# Altium integrated library Weidmueller_OMNIMATE_Signal.IntLib: 2550 symbols (part 8 of 45)
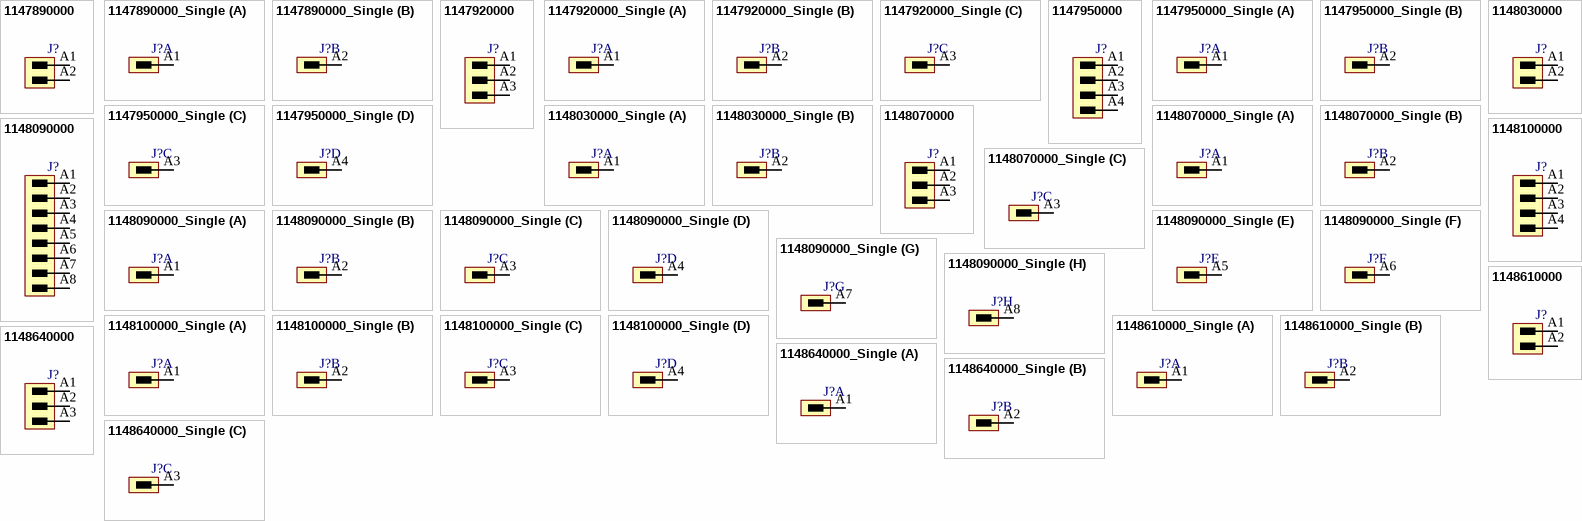
[diagram p218: symbols 1147890000 to 1148640000_Single]

## 1148100000_Single
designator J?
OMNIMATE Signal - series BL/SL 5.08; PartNumber: 1148100000; Manufacturer: Weidmueller; Short_text_for_material: SL 5.08HC/04/90B 3.2SN OR BX; Side_termination_characteristic: Dovetails for fixing blocks; Mounting_onto_the_PCB: Solder connection; Pitch_mm: 5.08 mm; Pitch_inch: 0.2 inch; No_of_poles: 4; Outgoing_elbow: 90°; Solder_pin_length_mm: 3.2 mm; Contact_material: Cu-Leg; Contact_surface: tinned; Insulating_material: PA GF; UL_94_flammability_rating: V-0; Rated_voltage_for_surge_voltage_class_pollution_degree_II_2: 400 V; Rated_voltage_use_group_B_UL_1059: 300 V; Rated_current_use_group_B_UL_1059: 15 A; PackageReference: SL_5_08HC_90B_04; Colour: Orange; Packaging: Box; Qty: 100 PCS; Revision: V1; ComponentLink1Description: Manufacturer URL; ComponentLink1URL: http://www.weidmueller.com/; ComponentLink2Description: URL Link1; ComponentLink2URL: http://catalog.weidmueller.com/catalog/Start.do?localeId=en&ObjectID=1148100000
footprint SL_5_08HC_90B_04 (OMNIMATE Signal - Serie BL/SL 5.08  SL 5.08HC/04/90B 3.2)
part A pins: A1
part B pins: A2
part C pins: A3
part D pins: A4

## 1148610000
designator J?
OMNIMATE Signal - series BL/SL 5.08; PartNumber: 1148610000; Manufacturer: Weidmueller; Short_text_for_material: SL 5.08HC/02/90F 3.2SN OR BX; Side_termination_characteristic: Flange; Mounting_onto_the_PCB: Solder connection; Pitch_mm: 5.08 mm; Pitch_inch: 0.2 inch; No_of_poles: 2; Outgoing_elbow: 90°; Solder_pin_length_mm: 3.2 mm; Contact_material: Cu-Leg; Contact_surface: tinned; Insulating_material: PA GF; UL_94_flammability_rating: V-0; Rated_voltage_for_surge_voltage_class_pollution_degree_II_2: 400 V; Rated_voltage_use_group_B_UL_1059: 300 V; Rated_current_use_group_B_UL_1059: 15 A; PackageReference: SL_5_08HC_90F_02; Colour: Orange; Packaging: Box; Qty: 100 PCS; Revision: V1; ComponentLink1Description: Manufacturer URL; ComponentLink1URL: http://www.weidmueller.com/; ComponentLink2Description: URL Link1; ComponentLink2URL: http://catalog.weidmueller.com/catalog/Start.do?localeId=en&ObjectID=1148610000
footprint SL_5_08HC_90F_02 (OMNIMATE Signal - Serie BL/SL 5.08  SL 5.08HC/02/90F 3.2)
pins: A1, A2

## 1148610000_Single
designator J?
OMNIMATE Signal - series BL/SL 5.08; PartNumber: 1148610000; Manufacturer: Weidmueller; Short_text_for_material: SL 5.08HC/02/90F 3.2SN OR BX; Side_termination_characteristic: Flange; Mounting_onto_the_PCB: Solder connection; Pitch_mm: 5.08 mm; Pitch_inch: 0.2 inch; No_of_poles: 2; Outgoing_elbow: 90°; Solder_pin_length_mm: 3.2 mm; Contact_material: Cu-Leg; Contact_surface: tinned; Insulating_material: PA GF; UL_94_flammability_rating: V-0; Rated_voltage_for_surge_voltage_class_pollution_degree_II_2: 400 V; Rated_voltage_use_group_B_UL_1059: 300 V; Rated_current_use_group_B_UL_1059: 15 A; PackageReference: SL_5_08HC_90F_02; Colour: Orange; Packaging: Box; Qty: 100 PCS; Revision: V1; ComponentLink1Description: Manufacturer URL; ComponentLink1URL: http://www.weidmueller.com/; ComponentLink2Description: URL Link1; ComponentLink2URL: http://catalog.weidmueller.com/catalog/Start.do?localeId=en&ObjectID=1148610000
footprint SL_5_08HC_90F_02 (OMNIMATE Signal - Serie BL/SL 5.08  SL 5.08HC/02/90F 3.2)
part A pins: A1
part B pins: A2

## 1148640000
designator J?
OMNIMATE Signal - series BL/SL 5.08; PartNumber: 1148640000; Manufacturer: Weidmueller; Short_text_for_material: SL 5.08HC/03/90F 3.2SN OR BX; Side_termination_characteristic: Flange; Mounting_onto_the_PCB: Solder connection; Pitch_mm: 5.08 mm; Pitch_inch: 0.2 inch; No_of_poles: 3; Outgoing_elbow: 90°; Solder_pin_length_mm: 3.2 mm; Contact_material: Cu-Leg; Contact_surface: tinned; Insulating_material: PA GF; UL_94_flammability_rating: V-0; Rated_voltage_for_surge_voltage_class_pollution_degree_II_2: 400 V; Rated_voltage_use_group_B_UL_1059: 300 V; Rated_current_use_group_B_UL_1059: 15 A; PackageReference: SL_5_08HC_90F_03; Colour: Orange; Packaging: Box; Qty: 100 PCS; Revision: V1; ComponentLink1Description: Manufacturer URL; ComponentLink1URL: http://www.weidmueller.com/; ComponentLink2Description: URL Link1; ComponentLink2URL: http://catalog.weidmueller.com/catalog/Start.do?localeId=en&ObjectID=1148640000
footprint SL_5_08HC_90F_03 (OMNIMATE Signal - Serie BL/SL 5.08  SL 5.08HC/03/90F 3.2)
pins: A1, A2, A3

## 1148640000_Single
designator J?
OMNIMATE Signal - series BL/SL 5.08; PartNumber: 1148640000; Manufacturer: Weidmueller; Short_text_for_material: SL 5.08HC/03/90F 3.2SN OR BX; Side_termination_characteristic: Flange; Mounting_onto_the_PCB: Solder connection; Pitch_mm: 5.08 mm; Pitch_inch: 0.2 inch; No_of_poles: 3; Outgoing_elbow: 90°; Solder_pin_length_mm: 3.2 mm; Contact_material: Cu-Leg; Contact_surface: tinned; Insulating_material: PA GF; UL_94_flammability_rating: V-0; Rated_voltage_for_surge_voltage_class_pollution_degree_II_2: 400 V; Rated_voltage_use_group_B_UL_1059: 300 V; Rated_current_use_group_B_UL_1059: 15 A; PackageReference: SL_5_08HC_90F_03; Colour: Orange; Packaging: Box; Qty: 100 PCS; Revision: V1; ComponentLink1Description: Manufacturer URL; ComponentLink1URL: http://www.weidmueller.com/; ComponentLink2Description: URL Link1; ComponentLink2URL: http://catalog.weidmueller.com/catalog/Start.do?localeId=en&ObjectID=1148640000
footprint SL_5_08HC_90F_03 (OMNIMATE Signal - Serie BL/SL 5.08  SL 5.08HC/03/90F 3.2)
part A pins: A1
part B pins: A2
part C pins: A3

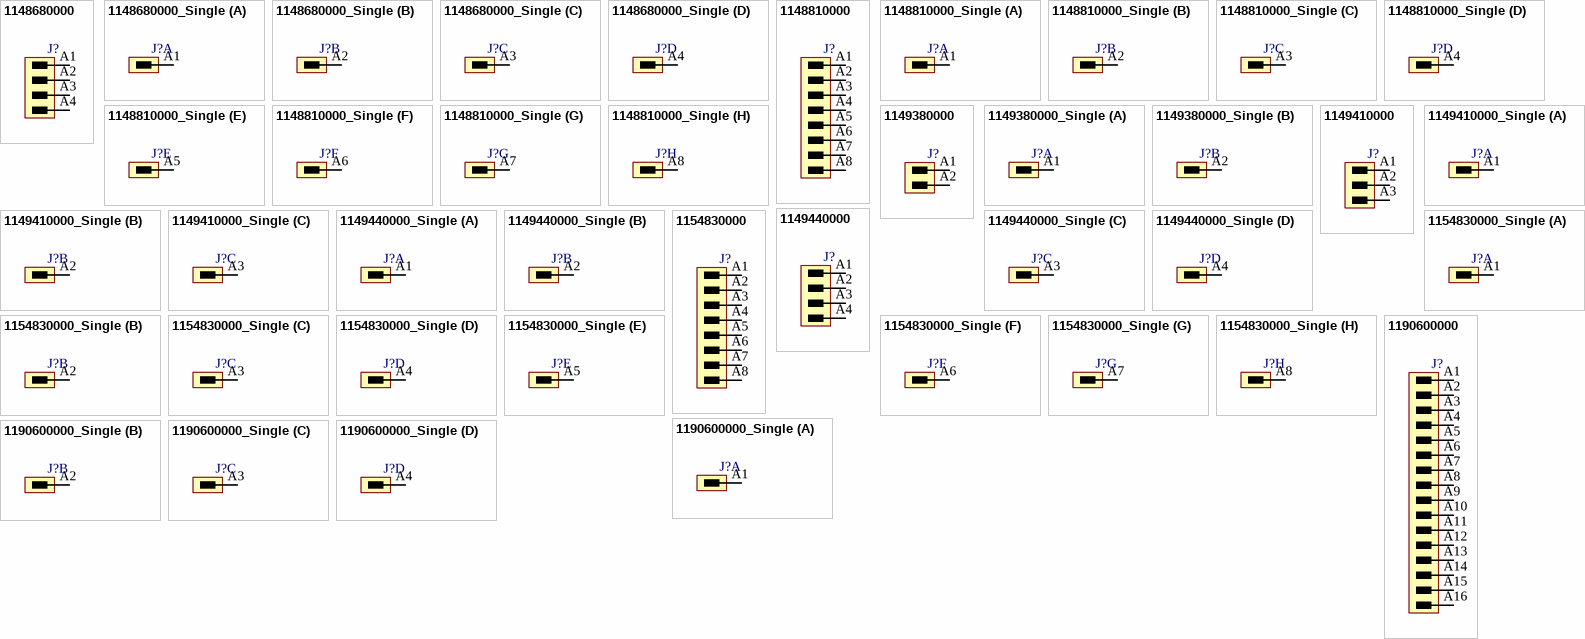
[diagram p44: symbols 1148680000 to 1190600000_Single]

## 1148680000
designator J?
OMNIMATE Signal - series BL/SL 5.08; PartNumber: 1148680000; Manufacturer: Weidmueller; Short_text_for_material: SL 5.08HC/04/90F 3.2SN OR BX; Side_termination_characteristic: Flange; Mounting_onto_the_PCB: Solder connection; Pitch_mm: 5.08 mm; Pitch_inch: 0.2 inch; No_of_poles: 4; Outgoing_elbow: 90°; Solder_pin_length_mm: 3.2 mm; Contact_material: Cu-Leg; Contact_surface: tinned; Insulating_material: PA GF; UL_94_flammability_rating: V-0; Rated_voltage_for_surge_voltage_class_pollution_degree_II_2: 400 V; Rated_voltage_use_group_B_UL_1059: 300 V; Rated_current_use_group_B_UL_1059: 15 A; PackageReference: SL_5_08HC_90F_04; Colour: Orange; Packaging: Box; Qty: 100 PCS; Revision: V1; ComponentLink1Description: Manufacturer URL; ComponentLink1URL: http://www.weidmueller.com/; ComponentLink2Description: URL Link1; ComponentLink2URL: http://catalog.weidmueller.com/catalog/Start.do?localeId=en&ObjectID=1148680000
footprint SL_5_08HC_90F_04 (OMNIMATE Signal - Serie BL/SL 5.08  SL 5.08HC/04/90F 3.2)
pins: A1, A2, A3, A4

## 1148680000_Single
designator J?
OMNIMATE Signal - series BL/SL 5.08; PartNumber: 1148680000; Manufacturer: Weidmueller; Short_text_for_material: SL 5.08HC/04/90F 3.2SN OR BX; Side_termination_characteristic: Flange; Mounting_onto_the_PCB: Solder connection; Pitch_mm: 5.08 mm; Pitch_inch: 0.2 inch; No_of_poles: 4; Outgoing_elbow: 90°; Solder_pin_length_mm: 3.2 mm; Contact_material: Cu-Leg; Contact_surface: tinned; Insulating_material: PA GF; UL_94_flammability_rating: V-0; Rated_voltage_for_surge_voltage_class_pollution_degree_II_2: 400 V; Rated_voltage_use_group_B_UL_1059: 300 V; Rated_current_use_group_B_UL_1059: 15 A; PackageReference: SL_5_08HC_90F_04; Colour: Orange; Packaging: Box; Qty: 100 PCS; Revision: V1; ComponentLink1Description: Manufacturer URL; ComponentLink1URL: http://www.weidmueller.com/; ComponentLink2Description: URL Link1; ComponentLink2URL: http://catalog.weidmueller.com/catalog/Start.do?localeId=en&ObjectID=1148680000
footprint SL_5_08HC_90F_04 (OMNIMATE Signal - Serie BL/SL 5.08  SL 5.08HC/04/90F 3.2)
part A pins: A1
part B pins: A2
part C pins: A3
part D pins: A4

## 1148810000
designator J?
OMNIMATE Signal - series BL/SL 5.08; PartNumber: 1148810000; Manufacturer: Weidmueller; Short_text_for_material: SL 5.08HC/08/90F 3.2SN OR BX; Side_termination_characteristic: Flange; Mounting_onto_the_PCB: Solder connection; Pitch_mm: 5.08 mm; Pitch_inch: 0.2 inch; No_of_poles: 8; Outgoing_elbow: 90°; Solder_pin_length_mm: 3.2 mm; Contact_material: Cu-Leg; Contact_surface: tinned; Insulating_material: PA GF; UL_94_flammability_rating: V-0; Rated_voltage_for_surge_voltage_class_pollution_degree_II_2: 400 V; Rated_voltage_use_group_B_UL_1059: 300 V; Rated_current_use_group_B_UL_1059: 15 A; PackageReference: SL_5_08HC_90F_08; Colour: Orange; Packaging: Box; Qty: 50 PCS; Revision: V1; ComponentLink1Description: Manufacturer URL; ComponentLink1URL: http://www.weidmueller.com/; ComponentLink2Description: URL Link1; ComponentLink2URL: http://catalog.weidmueller.com/catalog/Start.do?localeId=en&ObjectID=1148810000
footprint SL_5_08HC_90F_08 (OMNIMATE Signal - Serie BL/SL 5.08  SL 5.08HC/08/90F 3.2)
pins: A1, A2, A3, A4, A5, A6, A7, A8

## 1148810000_Single
designator J?
OMNIMATE Signal - series BL/SL 5.08; PartNumber: 1148810000; Manufacturer: Weidmueller; Short_text_for_material: SL 5.08HC/08/90F 3.2SN OR BX; Side_termination_characteristic: Flange; Mounting_onto_the_PCB: Solder connection; Pitch_mm: 5.08 mm; Pitch_inch: 0.2 inch; No_of_poles: 8; Outgoing_elbow: 90°; Solder_pin_length_mm: 3.2 mm; Contact_material: Cu-Leg; Contact_surface: tinned; Insulating_material: PA GF; UL_94_flammability_rating: V-0; Rated_voltage_for_surge_voltage_class_pollution_degree_II_2: 400 V; Rated_voltage_use_group_B_UL_1059: 300 V; Rated_current_use_group_B_UL_1059: 15 A; PackageReference: SL_5_08HC_90F_08; Colour: Orange; Packaging: Box; Qty: 50 PCS; Revision: V1; ComponentLink1Description: Manufacturer URL; ComponentLink1URL: http://www.weidmueller.com/; ComponentLink2Description: URL Link1; ComponentLink2URL: http://catalog.weidmueller.com/catalog/Start.do?localeId=en&ObjectID=1148810000
footprint SL_5_08HC_90F_08 (OMNIMATE Signal - Serie BL/SL 5.08  SL 5.08HC/08/90F 3.2)
part A pins: A1
part B pins: A2
part C pins: A3
part D pins: A4
part E pins: A5
part F pins: A6
part G pins: A7
part H pins: A8

## 1149380000
designator J?
OMNIMATE Signal - series BL/SL 5.08; PartNumber: 1149380000; Manufacturer: Weidmueller; Short_text_for_material: SL 5.08HC/02/90LF 3.2SN OR BX; Side_termination_characteristic: Solder flange; Mounting_onto_the_PCB: Solder connection; Pitch_mm: 5.08 mm; Pitch_inch: 0.2 inch; No_of_poles: 2; Outgoing_elbow: 90°; Solder_pin_length_mm: 3.2 mm; Contact_material: Cu-Leg; Contact_surface: tinned; Insulating_material: PA GF; UL_94_flammability_rating: V-0; Rated_voltage_for_surge_voltage_class_pollution_degree_II_2: 400 V; Rated_voltage_use_group_B_UL_1059: 300 V; Rated_current_use_group_B_UL_1059: 15 A; PackageReference: SL_5_08HC_90LF_02; Colour: Orange; Packaging: Box; Qty: 100 PCS; Revision: V1; ComponentLink1Description: Manufacturer URL; ComponentLink1URL: http://www.weidmueller.com/; ComponentLink2Description: URL Link1; ComponentLink2URL: http://catalog.weidmueller.com/catalog/Start.do?localeId=en&ObjectID=1149380000
footprint SL_5_08HC_90LF_02 (OMNIMATE Signal - Serie BL/SL 5.08  SL 5.08HC/02/90LF 3.2)
pins: A1, A2

## 1149380000_Single
designator J?
OMNIMATE Signal - series BL/SL 5.08; PartNumber: 1149380000; Manufacturer: Weidmueller; Short_text_for_material: SL 5.08HC/02/90LF 3.2SN OR BX; Side_termination_characteristic: Solder flange; Mounting_onto_the_PCB: Solder connection; Pitch_mm: 5.08 mm; Pitch_inch: 0.2 inch; No_of_poles: 2; Outgoing_elbow: 90°; Solder_pin_length_mm: 3.2 mm; Contact_material: Cu-Leg; Contact_surface: tinned; Insulating_material: PA GF; UL_94_flammability_rating: V-0; Rated_voltage_for_surge_voltage_class_pollution_degree_II_2: 400 V; Rated_voltage_use_group_B_UL_1059: 300 V; Rated_current_use_group_B_UL_1059: 15 A; PackageReference: SL_5_08HC_90LF_02; Colour: Orange; Packaging: Box; Qty: 100 PCS; Revision: V1; ComponentLink1Description: Manufacturer URL; ComponentLink1URL: http://www.weidmueller.com/; ComponentLink2Description: URL Link1; ComponentLink2URL: http://catalog.weidmueller.com/catalog/Start.do?localeId=en&ObjectID=1149380000
footprint SL_5_08HC_90LF_02 (OMNIMATE Signal - Serie BL/SL 5.08  SL 5.08HC/02/90LF 3.2)
part A pins: A1
part B pins: A2

## 1149410000
designator J?
OMNIMATE Signal - series BL/SL 5.08; PartNumber: 1149410000; Manufacturer: Weidmueller; Short_text_for_material: SL 5.08HC/03/90LF 3.2SN OR BX; Side_termination_characteristic: Solder flange; Mounting_onto_the_PCB: Solder connection; Pitch_mm: 5.08 mm; Pitch_inch: 0.2 inch; No_of_poles: 3; Outgoing_elbow: 90°; Solder_pin_length_mm: 3.2 mm; Contact_material: Cu-Leg; Contact_surface: tinned; Insulating_material: PA GF; UL_94_flammability_rating: V-0; Rated_voltage_for_surge_voltage_class_pollution_degree_II_2: 400 V; Rated_voltage_use_group_B_UL_1059: 300 V; Rated_current_use_group_B_UL_1059: 15 A; PackageReference: SL_5_08HC_90LF_03; Colour: Orange; Packaging: Box; Qty: 100 PCS; Revision: V1; ComponentLink1Description: Manufacturer URL; ComponentLink1URL: http://www.weidmueller.com/; ComponentLink2Description: URL Link1; ComponentLink2URL: http://catalog.weidmueller.com/catalog/Start.do?localeId=en&ObjectID=1149410000
footprint SL_5_08HC_90LF_03 (OMNIMATE Signal - Serie BL/SL 5.08  SL 5.08HC/03/90LF 3.2)
pins: A1, A2, A3

## 1149410000_Single
designator J?
OMNIMATE Signal - series BL/SL 5.08; PartNumber: 1149410000; Manufacturer: Weidmueller; Short_text_for_material: SL 5.08HC/03/90LF 3.2SN OR BX; Side_termination_characteristic: Solder flange; Mounting_onto_the_PCB: Solder connection; Pitch_mm: 5.08 mm; Pitch_inch: 0.2 inch; No_of_poles: 3; Outgoing_elbow: 90°; Solder_pin_length_mm: 3.2 mm; Contact_material: Cu-Leg; Contact_surface: tinned; Insulating_material: PA GF; UL_94_flammability_rating: V-0; Rated_voltage_for_surge_voltage_class_pollution_degree_II_2: 400 V; Rated_voltage_use_group_B_UL_1059: 300 V; Rated_current_use_group_B_UL_1059: 15 A; PackageReference: SL_5_08HC_90LF_03; Colour: Orange; Packaging: Box; Qty: 100 PCS; Revision: V1; ComponentLink1Description: Manufacturer URL; ComponentLink1URL: http://www.weidmueller.com/; ComponentLink2Description: URL Link1; ComponentLink2URL: http://catalog.weidmueller.com/catalog/Start.do?localeId=en&ObjectID=1149410000
footprint SL_5_08HC_90LF_03 (OMNIMATE Signal - Serie BL/SL 5.08  SL 5.08HC/03/90LF 3.2)
part A pins: A1
part B pins: A2
part C pins: A3

## 1149440000
designator J?
OMNIMATE Signal - series BL/SL 5.08; PartNumber: 1149440000; Manufacturer: Weidmueller; Short_text_for_material: SL 5.08HC/04/90LF 3.2SN OR BX; Side_termination_characteristic: Solder flange; Mounting_onto_the_PCB: Solder connection; Pitch_mm: 5.08 mm; Pitch_inch: 0.2 inch; No_of_poles: 4; Outgoing_elbow: 90°; Solder_pin_length_mm: 3.2 mm; Contact_material: Cu-Leg; Contact_surface: tinned; Insulating_material: PA GF; UL_94_flammability_rating: V-0; Rated_voltage_for_surge_voltage_class_pollution_degree_II_2: 400 V; Rated_voltage_use_group_B_UL_1059: 300 V; Rated_current_use_group_B_UL_1059: 15 A; PackageReference: SL_5_08HC_90LF_04; Colour: Orange; Packaging: Box; Qty: 100 PCS; Revision: V1; ComponentLink1Description: Manufacturer URL; ComponentLink1URL: http://www.weidmueller.com/; ComponentLink2Description: URL Link1; ComponentLink2URL: http://catalog.weidmueller.com/catalog/Start.do?localeId=en&ObjectID=1149440000
footprint SL_5_08HC_90LF_04 (OMNIMATE Signal - Serie BL/SL 5.08  SL 5.08HC/04/90LF 3.2)
pins: A1, A2, A3, A4

## 1149440000_Single
designator J?
OMNIMATE Signal - series BL/SL 5.08; PartNumber: 1149440000; Manufacturer: Weidmueller; Short_text_for_material: SL 5.08HC/04/90LF 3.2SN OR BX; Side_termination_characteristic: Solder flange; Mounting_onto_the_PCB: Solder connection; Pitch_mm: 5.08 mm; Pitch_inch: 0.2 inch; No_of_poles: 4; Outgoing_elbow: 90°; Solder_pin_length_mm: 3.2 mm; Contact_material: Cu-Leg; Contact_surface: tinned; Insulating_material: PA GF; UL_94_flammability_rating: V-0; Rated_voltage_for_surge_voltage_class_pollution_degree_II_2: 400 V; Rated_voltage_use_group_B_UL_1059: 300 V; Rated_current_use_group_B_UL_1059: 15 A; PackageReference: SL_5_08HC_90LF_04; Colour: Orange; Packaging: Box; Qty: 100 PCS; Revision: V1; ComponentLink1Description: Manufacturer URL; ComponentLink1URL: http://www.weidmueller.com/; ComponentLink2Description: URL Link1; ComponentLink2URL: http://catalog.weidmueller.com/catalog/Start.do?localeId=en&ObjectID=1149440000
footprint SL_5_08HC_90LF_04 (OMNIMATE Signal - Serie BL/SL 5.08  SL 5.08HC/04/90LF 3.2)
part A pins: A1
part B pins: A2
part C pins: A3
part D pins: A4

## 1154830000
designator J?
OMNIMATE Signal - series BL/SL 5.08; PartNumber: 1154830000; Manufacturer: Weidmueller; Short_text_for_material: SL 5.08HC/08/90B 3.2SN OR BX; Side_termination_characteristic: Dovetails for fixing blocks; Mounting_onto_the_PCB: Solder connection; Pitch_mm: 5.08 mm; Pitch_inch: 0.2 inch; No_of_poles: 8; Outgoing_elbow: 90°; Solder_pin_length_mm: 3.2 mm; Contact_material: Cu-Leg; Contact_surface: tinned; Insulating_material: PA GF; UL_94_flammability_rating: V-0; Rated_voltage_for_surge_voltage_class_pollution_degree_II_2: 400 V; Rated_voltage_use_group_B_UL_1059: 300 V; Rated_current_use_group_B_UL_1059: 15 A; PackageReference: SL_5_08HC_90B_08; Colour: Orange; Packaging: Box; Qty: 50 PCS; Revision: V1; ComponentLink1Description: Manufacturer URL; ComponentLink1URL: http://www.weidmueller.com/; ComponentLink2Description: URL Link1; ComponentLink2URL: http://catalog.weidmueller.com/catalog/Start.do?localeId=en&ObjectID=1154830000
footprint SL_5_08HC_90B_08 (OMNIMATE Signal - Serie BL/SL 5.08  SL 5.08HC/08/90B 3.2)
pins: A1, A2, A3, A4, A5, A6, A7, A8

## 1154830000_Single
designator J?
OMNIMATE Signal - series BL/SL 5.08; PartNumber: 1154830000; Manufacturer: Weidmueller; Short_text_for_material: SL 5.08HC/08/90B 3.2SN OR BX; Side_termination_characteristic: Dovetails for fixing blocks; Mounting_onto_the_PCB: Solder connection; Pitch_mm: 5.08 mm; Pitch_inch: 0.2 inch; No_of_poles: 8; Outgoing_elbow: 90°; Solder_pin_length_mm: 3.2 mm; Contact_material: Cu-Leg; Contact_surface: tinned; Insulating_material: PA GF; UL_94_flammability_rating: V-0; Rated_voltage_for_surge_voltage_class_pollution_degree_II_2: 400 V; Rated_voltage_use_group_B_UL_1059: 300 V; Rated_current_use_group_B_UL_1059: 15 A; PackageReference: SL_5_08HC_90B_08; Colour: Orange; Packaging: Box; Qty: 50 PCS; Revision: V1; ComponentLink1Description: Manufacturer URL; ComponentLink1URL: http://www.weidmueller.com/; ComponentLink2Description: URL Link1; ComponentLink2URL: http://catalog.weidmueller.com/catalog/Start.do?localeId=en&ObjectID=1154830000
footprint SL_5_08HC_90B_08 (OMNIMATE Signal - Serie BL/SL 5.08  SL 5.08HC/08/90B 3.2)
part A pins: A1
part B pins: A2
part C pins: A3
part D pins: A4
part E pins: A5
part F pins: A6
part G pins: A7
part H pins: A8

## 1190600000
designator J?
OMNIMATE Signal - series BL/SL 5.08; PartNumber: 1190600000; Manufacturer: Weidmueller; Short_text_for_material: SLH-THR5.08/16/180F 3.2SN BK BX; Pitch_mm: 5.08 mm; Pitch_inch: 0.2 inch; No_of_poles: 16; Solder_pin_length_mm: 3.2 mm; Contact_material: CuSn; Contact_surface: tinned; Insulating_material: LCP GF; UL_94_flammability_rating: V-0; Rated_voltage_for_surge_voltage_class_pollution_degree_II_2: 320 V; Rated_voltage_use_group_B_UL_1059: 300 V; Rated_current_use_group_B_UL_1059: 10 A; PackageReference: SLH_THR_5_08_180F_16; Colour: Black; Packaging: Box; Qty: 10 PCS; Revision: V1; ComponentLink1Description: Manufacturer URL; ComponentLink1URL: http://www.weidmueller.com/; ComponentLink2Description: URL Link1; ComponentLink2URL: http://catalog.weidmueller.com/catalog/Start.do?localeId=en&ObjectID=1190600000
footprint SLH_THR_5_08_180F_16 (OMNIMATE Signal - Serie BL/SL 5.08  SLH-THR5.08/16/180F 3.2)
pins: A1, A2, A3, A4, A5, A6, A7, A8, A9, A10, A11, A12, A13, A14, A15, A16

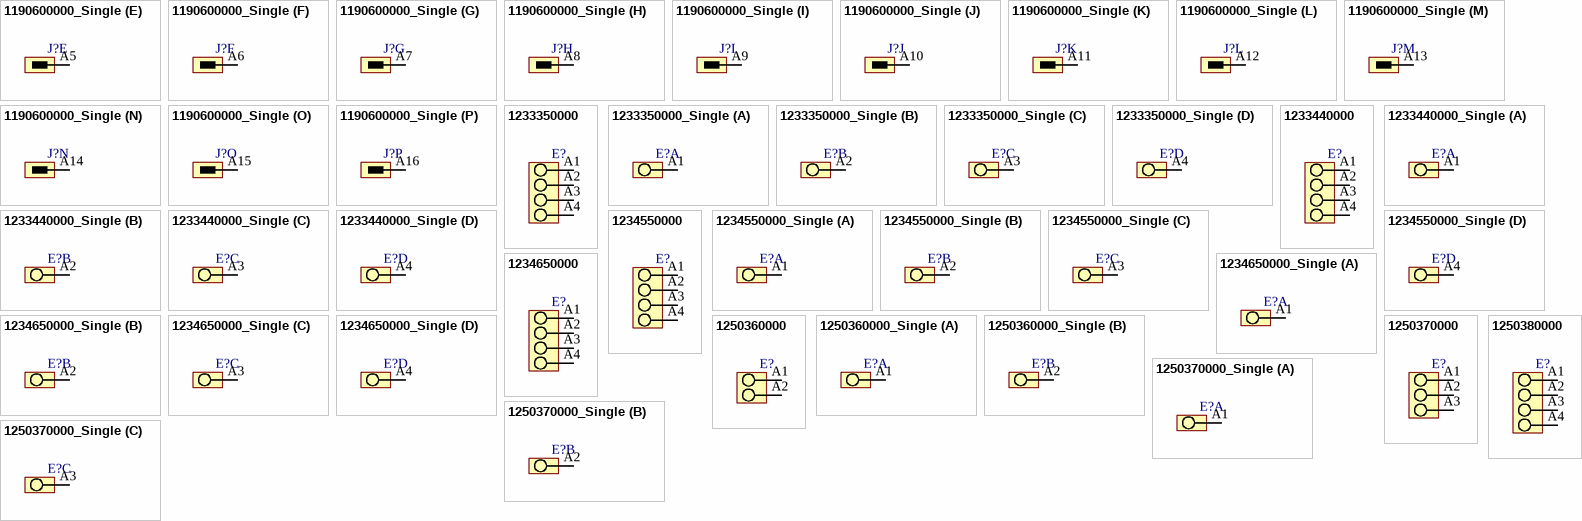
[diagram p45: symbols 1190600000_Single to 1250380000]

## 1190600000_Single
designator J?
OMNIMATE Signal - series BL/SL 5.08; PartNumber: 1190600000; Manufacturer: Weidmueller; Short_text_for_material: SLH-THR5.08/16/180F 3.2SN BK BX; Pitch_mm: 5.08 mm; Pitch_inch: 0.2 inch; No_of_poles: 16; Solder_pin_length_mm: 3.2 mm; Contact_material: CuSn; Contact_surface: tinned; Insulating_material: LCP GF; UL_94_flammability_rating: V-0; Rated_voltage_for_surge_voltage_class_pollution_degree_II_2: 320 V; Rated_voltage_use_group_B_UL_1059: 300 V; Rated_current_use_group_B_UL_1059: 10 A; PackageReference: SLH_THR_5_08_180F_16; Colour: Black; Packaging: Box; Qty: 10 PCS; Revision: V1; ComponentLink1Description: Manufacturer URL; ComponentLink1URL: http://www.weidmueller.com/; ComponentLink2Description: URL Link1; ComponentLink2URL: http://catalog.weidmueller.com/catalog/Start.do?localeId=en&ObjectID=1190600000
footprint SLH_THR_5_08_180F_16 (OMNIMATE Signal - Serie BL/SL 5.08  SLH-THR5.08/16/180F 3.2)
part A pins: A1
part B pins: A2
part C pins: A3
part D pins: A4
part E pins: A5
part F pins: A6
part G pins: A7
part H pins: A8
part I pins: A9
part J pins: A10
part K pins: A11
part L pins: A12
part M pins: A13
part N pins: A14
part O pins: A15
part P pins: A16

## 1233350000
designator E?
OMNIMATE Signal - series LP; PartNumber: 1233350000; Manufacturer: Weidmueller; Short_text_for_material: LP 5.08/04/180 3.2SN OR BX; Side_termination_characteristic: closed side; Mounting_onto_the_PCB: Solder connection; Pitch_mm: 5,08 mm; Pitch_inch: 0,2 inch; No_of_poles: 4; Solder_pin_length_mm: 3,2 mm; Contact_material: Cu-Leg; Contact_surface: tinned; Insulating_material: PA; UL_94_flammability_rating: V-2; Rated_voltage_for_surge_voltage_class_pollution_degree_II_2: 500 V; Solid_min_H05_07_V_U: 0,5 mm²; Solid_max_H05_07_V_U: 6 mm²; Rated_voltage_use_group_B_UL_1059: 300 V; Rated_current_use_group_B_UL_1059: 20 A; Wire_cross_section_AWG_min_UL_1059: AWG 26; Wire_cross_section_AWG_max_UL_1059: AWG 12; PackageReference: LP_5_08_180_04; Colour: Orange; Packaging: Box; Qty: 100 PCS; Revision: V1; ComponentLink1Description: Manufacturer URL; ComponentLink1URL: http://www.weidmueller.com/; ComponentLink2Description: URL Link1; ComponentLink2URL: http://catalog.weidmueller.com/catalog/Start.do?localeId=en&ObjectID=1233350000
footprint LP_5_08_180_04 (OMNIMATE Signal - Serie LP  LP 5.08/04/180 3.2)
pins: A1, A2, A3, A4
1 alternate drawing of the same symbol

## 1233350000_Single
designator E?
OMNIMATE Signal - series LP; PartNumber: 1233350000; Manufacturer: Weidmueller; Short_text_for_material: LP 5.08/04/180 3.2SN OR BX; Side_termination_characteristic: closed side; Mounting_onto_the_PCB: Solder connection; Pitch_mm: 5,08 mm; Pitch_inch: 0,2 inch; No_of_poles: 4; Solder_pin_length_mm: 3,2 mm; Contact_material: Cu-Leg; Contact_surface: tinned; Insulating_material: PA; UL_94_flammability_rating: V-2; Rated_voltage_for_surge_voltage_class_pollution_degree_II_2: 500 V; Solid_min_H05_07_V_U: 0,5 mm²; Solid_max_H05_07_V_U: 6 mm²; Rated_voltage_use_group_B_UL_1059: 300 V; Rated_current_use_group_B_UL_1059: 20 A; Wire_cross_section_AWG_min_UL_1059: AWG 26; Wire_cross_section_AWG_max_UL_1059: AWG 12; PackageReference: LP_5_08_180_04; Colour: Orange; Packaging: Box; Qty: 100 PCS; Revision: V1; ComponentLink1Description: Manufacturer URL; ComponentLink1URL: http://www.weidmueller.com/; ComponentLink2Description: URL Link1; ComponentLink2URL: http://catalog.weidmueller.com/catalog/Start.do?localeId=en&ObjectID=1233350000
footprint LP_5_08_180_04 (OMNIMATE Signal - Serie LP  LP 5.08/04/180 3.2)
part A pins: A1
part B pins: A2
part C pins: A3
part D pins: A4
1 alternate drawing of the same symbol

## 1233440000
designator E?
OMNIMATE Signal - series LP; PartNumber: 1233440000; Manufacturer: Weidmueller; Short_text_for_material: LP 5.00/04/180 3.2SN OR BX; Side_termination_characteristic: closed side; Mounting_onto_the_PCB: Solder connection; Pitch_mm: 5 mm; Pitch_inch: 0,197 inch; No_of_poles: 4; Solder_pin_length_mm: 3,2 mm; Contact_material: Cu-Leg; Contact_surface: tinned; Insulating_material: PA; UL_94_flammability_rating: V-2; Rated_voltage_for_surge_voltage_class_pollution_degree_II_2: 500 V; Solid_min_H05_07_V_U: 0,5 mm²; Solid_max_H05_07_V_U: 6 mm²; Rated_voltage_use_group_B_UL_1059: 300 V; Rated_current_use_group_B_UL_1059: 20 A; Wire_cross_section_AWG_min_UL_1059: AWG 26; Wire_cross_section_AWG_max_UL_1059: AWG 12; PackageReference: LP_5_00_180_04; Colour: Orange; Packaging: Box; Qty: 100 PCS; Revision: V1; ComponentLink1Description: Manufacturer URL; ComponentLink1URL: http://www.weidmueller.com/; ComponentLink2Description: URL Link1; ComponentLink2URL: http://catalog.weidmueller.com/catalog/Start.do?localeId=en&ObjectID=1233440000
footprint LP_5_00_180_04 (OMNIMATE Signal - Serie LP  LP 5.00/04/180 3.2)
pins: A1, A2, A3, A4
1 alternate drawing of the same symbol

## 1233440000_Single
designator E?
OMNIMATE Signal - series LP; PartNumber: 1233440000; Manufacturer: Weidmueller; Short_text_for_material: LP 5.00/04/180 3.2SN OR BX; Side_termination_characteristic: closed side; Mounting_onto_the_PCB: Solder connection; Pitch_mm: 5 mm; Pitch_inch: 0,197 inch; No_of_poles: 4; Solder_pin_length_mm: 3,2 mm; Contact_material: Cu-Leg; Contact_surface: tinned; Insulating_material: PA; UL_94_flammability_rating: V-2; Rated_voltage_for_surge_voltage_class_pollution_degree_II_2: 500 V; Solid_min_H05_07_V_U: 0,5 mm²; Solid_max_H05_07_V_U: 6 mm²; Rated_voltage_use_group_B_UL_1059: 300 V; Rated_current_use_group_B_UL_1059: 20 A; Wire_cross_section_AWG_min_UL_1059: AWG 26; Wire_cross_section_AWG_max_UL_1059: AWG 12; PackageReference: LP_5_00_180_04; Colour: Orange; Packaging: Box; Qty: 100 PCS; Revision: V1; ComponentLink1Description: Manufacturer URL; ComponentLink1URL: http://www.weidmueller.com/; ComponentLink2Description: URL Link1; ComponentLink2URL: http://catalog.weidmueller.com/catalog/Start.do?localeId=en&ObjectID=1233440000
footprint LP_5_00_180_04 (OMNIMATE Signal - Serie LP  LP 5.00/04/180 3.2)
part A pins: A1
part B pins: A2
part C pins: A3
part D pins: A4
1 alternate drawing of the same symbol

## 1234550000
designator E?
OMNIMATE Signal - series PM; PartNumber: 1234550000; Manufacturer: Weidmueller; Short_text_for_material: PM 5.08/04/90 3.5SN OR BX; Side_termination_characteristic: closed side; Mounting_onto_the_PCB: Solder connection; Pitch_mm: 5,08 mm; Pitch_inch: 0,2 inch; No_of_poles: 4; Solder_pin_length_mm: 3,5 mm; Contact_material: Cu-Leg; Contact_surface: tinned; Insulating_material: Wemid (PA); UL_94_flammability_rating: V-0; Rated_voltage_for_surge_voltage_class_pollution_degree_II_2: 600 V; Solid_min_H05_07_V_U: 0,13 mm²; Solid_max_H05_07_V_U: 2,5 mm²; Rated_voltage_use_group_B_UL_1059: 300 V; Rated_current_use_group_B_UL_1059: 15 A; Wire_cross_section_AWG_min_UL_1059: AWG 26; Wire_cross_section_AWG_max_UL_1059: AWG 14; PackageReference: PM_5_08_90_04; Colour: Orange; Packaging: Box; Qty: 100 PCS; Revision: V1; ComponentLink1Description: Manufacturer URL; ComponentLink1URL: http://www.weidmueller.com/; ComponentLink2Description: URL Link1; ComponentLink2URL: http://catalog.weidmueller.com/catalog/Start.do?localeId=en&ObjectID=1234550000
footprint PM_5_08_90_04 (PM 5.08/04/90 3.5)
pins: A1, A2, A3, A4
1 alternate drawing of the same symbol

## 1234550000_Single
designator E?
OMNIMATE Signal - series PM; PartNumber: 1234550000; Manufacturer: Weidmueller; Short_text_for_material: PM 5.08/04/90 3.5SN OR BX; Side_termination_characteristic: closed side; Mounting_onto_the_PCB: Solder connection; Pitch_mm: 5,08 mm; Pitch_inch: 0,2 inch; No_of_poles: 4; Solder_pin_length_mm: 3,5 mm; Contact_material: Cu-Leg; Contact_surface: tinned; Insulating_material: Wemid (PA); UL_94_flammability_rating: V-0; Rated_voltage_for_surge_voltage_class_pollution_degree_II_2: 600 V; Solid_min_H05_07_V_U: 0,13 mm²; Solid_max_H05_07_V_U: 2,5 mm²; Rated_voltage_use_group_B_UL_1059: 300 V; Rated_current_use_group_B_UL_1059: 15 A; Wire_cross_section_AWG_min_UL_1059: AWG 26; Wire_cross_section_AWG_max_UL_1059: AWG 14; PackageReference: PM_5_08_90_04; Colour: Orange; Packaging: Box; Qty: 100 PCS; Revision: V1; ComponentLink1Description: Manufacturer URL; ComponentLink1URL: http://www.weidmueller.com/; ComponentLink2Description: URL Link1; ComponentLink2URL: http://catalog.weidmueller.com/catalog/Start.do?localeId=en&ObjectID=1234550000
footprint PM_5_08_90_04 (PM 5.08/04/90 3.5)
part A pins: A1
part B pins: A2
part C pins: A3
part D pins: A4
1 alternate drawing of the same symbol

## 1234650000
designator E?
OMNIMATE Signal - series PM; PartNumber: 1234650000; Manufacturer: Weidmueller; Short_text_for_material: PM 5.00/04/90 3.5SN OR BX; Side_termination_characteristic: closed side; Mounting_onto_the_PCB: Solder connection; Pitch_mm: 5 mm; Pitch_inch: 0,197 inch; No_of_poles: 4; Solder_pin_length_mm: 3,5 mm; Contact_material: Cu-Leg; Contact_surface: tinned; Insulating_material: Wemid (PA); UL_94_flammability_rating: V-0; Rated_voltage_for_surge_voltage_class_pollution_degree_II_2: 600 V; Solid_min_H05_07_V_U: 0,13 mm²; Solid_max_H05_07_V_U: 2,5 mm²; Rated_voltage_use_group_B_UL_1059: 300 V; Rated_current_use_group_B_UL_1059: 15 A; Wire_cross_section_AWG_min_UL_1059: AWG 26; Wire_cross_section_AWG_max_UL_1059: AWG 14; PackageReference: PM_5_00_90_04; Colour: Orange; Packaging: Box; Qty: 100 PCS; Revision: V1; ComponentLink1Description: Manufacturer URL; ComponentLink1URL: http://www.weidmueller.com/; ComponentLink2Description: URL Link1; ComponentLink2URL: http://catalog.weidmueller.com/catalog/Start.do?localeId=en&ObjectID=1234650000
footprint PM_5_00_90_04 (PM 5.00/04/90 3.5)
pins: A1, A2, A3, A4
1 alternate drawing of the same symbol

## 1234650000_Single
designator E?
OMNIMATE Signal - series PM; PartNumber: 1234650000; Manufacturer: Weidmueller; Short_text_for_material: PM 5.00/04/90 3.5SN OR BX; Side_termination_characteristic: closed side; Mounting_onto_the_PCB: Solder connection; Pitch_mm: 5 mm; Pitch_inch: 0,197 inch; No_of_poles: 4; Solder_pin_length_mm: 3,5 mm; Contact_material: Cu-Leg; Contact_surface: tinned; Insulating_material: Wemid (PA); UL_94_flammability_rating: V-0; Rated_voltage_for_surge_voltage_class_pollution_degree_II_2: 600 V; Solid_min_H05_07_V_U: 0,13 mm²; Solid_max_H05_07_V_U: 2,5 mm²; Rated_voltage_use_group_B_UL_1059: 300 V; Rated_current_use_group_B_UL_1059: 15 A; Wire_cross_section_AWG_min_UL_1059: AWG 26; Wire_cross_section_AWG_max_UL_1059: AWG 14; PackageReference: PM_5_00_90_04; Colour: Orange; Packaging: Box; Qty: 100 PCS; Revision: V1; ComponentLink1Description: Manufacturer URL; ComponentLink1URL: http://www.weidmueller.com/; ComponentLink2Description: URL Link1; ComponentLink2URL: http://catalog.weidmueller.com/catalog/Start.do?localeId=en&ObjectID=1234650000
footprint PM_5_00_90_04 (PM 5.00/04/90 3.5)
part A pins: A1
part B pins: A2
part C pins: A3
part D pins: A4
1 alternate drawing of the same symbol

## 1250360000
designator E?
OMNIMATE Signal - series LSF; PartNumber: 1250360000; Manufacturer: Weidmueller; Short_text_for_material: LSF-SMD 3.50/02/180 SN BK RL; Side_termination_characteristic: closed side; Mounting_onto_the_PCB: Reflow solder connection; Pitch_mm: 3,5 mm; Pitch_inch: 0,138 inch; No_of_poles: 2; Contact_material: Cu-Leg; Contact_surface: tinned; Insulating_material: LCP GF; UL_94_flammability_rating: V-0; Rated_voltage_for_surge_voltage_class_pollution_degree_II_2: 320 V; Solid_min_H05_07_V_U: 0,2 mm²; Solid_max_H05_07_V_U: 1,5 mm²; Rated_voltage_use_group_B_UL_1059: 300 V; Rated_current_use_group_B_UL_1059: 12 A; Wire_cross_section_AWG_min_UL_1059: AWG 24; Wire_cross_section_AWG_max_UL_1059: AWG 16; PackageReference: LSF_SMD_3_5_180_02; Colour: Black; Packaging: Tape; Qty: 180 PCS; Revision: V1; ComponentLink1Description: Manufacturer URL; ComponentLink1URL: http://www.weidmueller.com/; ComponentLink2Description: URL Link1; ComponentLink2URL: http://catalog.weidmueller.com/catalog/Start.do?localeId=en&ObjectID=1250360000
footprint LSF_SMD_3_5_180_02 (OMNIMATE Signal - Serie LSF  LSF-SMD 3.50/02/180)
pins: A1, A2
1 alternate drawing of the same symbol

## 1250360000_Single
designator E?
OMNIMATE Signal - series LSF; PartNumber: 1250360000; Manufacturer: Weidmueller; Short_text_for_material: LSF-SMD 3.50/02/180 SN BK RL; Side_termination_characteristic: closed side; Mounting_onto_the_PCB: Reflow solder connection; Pitch_mm: 3,5 mm; Pitch_inch: 0,138 inch; No_of_poles: 2; Contact_material: Cu-Leg; Contact_surface: tinned; Insulating_material: LCP GF; UL_94_flammability_rating: V-0; Rated_voltage_for_surge_voltage_class_pollution_degree_II_2: 320 V; Solid_min_H05_07_V_U: 0,2 mm²; Solid_max_H05_07_V_U: 1,5 mm²; Rated_voltage_use_group_B_UL_1059: 300 V; Rated_current_use_group_B_UL_1059: 12 A; Wire_cross_section_AWG_min_UL_1059: AWG 24; Wire_cross_section_AWG_max_UL_1059: AWG 16; PackageReference: LSF_SMD_3_5_180_02; Colour: Black; Packaging: Tape; Qty: 180 PCS; Revision: V1; ComponentLink1Description: Manufacturer URL; ComponentLink1URL: http://www.weidmueller.com/; ComponentLink2Description: URL Link1; ComponentLink2URL: http://catalog.weidmueller.com/catalog/Start.do?localeId=en&ObjectID=1250360000
footprint LSF_SMD_3_5_180_02 (OMNIMATE Signal - Serie LSF  LSF-SMD 3.50/02/180)
part A pins: A1
part B pins: A2
1 alternate drawing of the same symbol

## 1250370000
designator E?
OMNIMATE Signal - series LSF; PartNumber: 1250370000; Manufacturer: Weidmueller; Short_text_for_material: LSF-SMD 3.50/03/180 SN BK RL; Side_termination_characteristic: closed side; Mounting_onto_the_PCB: Reflow solder connection; Pitch_mm: 3,5 mm; Pitch_inch: 0,138 inch; No_of_poles: 3; Contact_material: Cu-Leg; Contact_surface: tinned; Insulating_material: LCP GF; UL_94_flammability_rating: V-0; Rated_voltage_for_surge_voltage_class_pollution_degree_II_2: 320 V; Solid_min_H05_07_V_U: 0,2 mm²; Solid_max_H05_07_V_U: 1,5 mm²; Rated_voltage_use_group_B_UL_1059: 300 V; Rated_current_use_group_B_UL_1059: 12 A; Wire_cross_section_AWG_min_UL_1059: AWG 24; Wire_cross_section_AWG_max_UL_1059: AWG 16; PackageReference: LSF_SMD_3_5_180_03; Colour: Black; Packaging: Tape; Qty: 180 PCS; Revision: V1; ComponentLink1Description: Manufacturer URL; ComponentLink1URL: http://www.weidmueller.com/; ComponentLink2Description: URL Link1; ComponentLink2URL: http://catalog.weidmueller.com/catalog/Start.do?localeId=en&ObjectID=1250370000
footprint LSF_SMD_3_5_180_03 (OMNIMATE Signal - Serie LSF  LSF-SMD 3.50/03/180)
pins: A1, A2, A3
1 alternate drawing of the same symbol

## 1250370000_Single
designator E?
OMNIMATE Signal - series LSF; PartNumber: 1250370000; Manufacturer: Weidmueller; Short_text_for_material: LSF-SMD 3.50/03/180 SN BK RL; Side_termination_characteristic: closed side; Mounting_onto_the_PCB: Reflow solder connection; Pitch_mm: 3,5 mm; Pitch_inch: 0,138 inch; No_of_poles: 3; Contact_material: Cu-Leg; Contact_surface: tinned; Insulating_material: LCP GF; UL_94_flammability_rating: V-0; Rated_voltage_for_surge_voltage_class_pollution_degree_II_2: 320 V; Solid_min_H05_07_V_U: 0,2 mm²; Solid_max_H05_07_V_U: 1,5 mm²; Rated_voltage_use_group_B_UL_1059: 300 V; Rated_current_use_group_B_UL_1059: 12 A; Wire_cross_section_AWG_min_UL_1059: AWG 24; Wire_cross_section_AWG_max_UL_1059: AWG 16; PackageReference: LSF_SMD_3_5_180_03; Colour: Black; Packaging: Tape; Qty: 180 PCS; Revision: V1; ComponentLink1Description: Manufacturer URL; ComponentLink1URL: http://www.weidmueller.com/; ComponentLink2Description: URL Link1; ComponentLink2URL: http://catalog.weidmueller.com/catalog/Start.do?localeId=en&ObjectID=1250370000
footprint LSF_SMD_3_5_180_03 (OMNIMATE Signal - Serie LSF  LSF-SMD 3.50/03/180)
part A pins: A1
part B pins: A2
part C pins: A3
1 alternate drawing of the same symbol